# Altium schematic symbol library BARKO_SCHLIB.SchLib: 1064 symbols (part 9 of 11) (continued)
## R-10M-0603 (continued)
RES SMD 10M OHM 5% 1/10W 0603; Manufacturer: Yageo; Manufacturer Part Number: RC0603JR-0710ML; Resistance: 10MR; Temperature Coefficient: 100ppm/°C; Voltage Rating (DC): 50V; Power Rating: 100mW; .PCBCHK: USED; .Creator: F:TALI; Washability: OK; Stock 1: 1106306; Pricing 1: 1=0.1, 10=0.022, 100=0.0088, 1000=0.00396, 2500=0.00344 (USD); Case/Package: 0603; Number of Pins: 2; Contact Plating: Matte,Tin; Case Code (Metric): 1608; Min Operating Temperature: -55°C; Max Operating Temperature: 155°C; Tolerance: 5%; Composition: Thick Film; Packaging: Tape and Reel; Voltage Rating: 50V; Package Quantity: 1; Number of Terminations: 2; Termination: SMD/SMT; Military Standard: Not; Max Power Dissipation: 100mW; Features: Moisture Resistant; Length: 0.063inch; Height: 0.022inch; Width: 0.031inch; Depth: 0.8mm; Radiation Hardening: No; REACH SVHC: No SVHC; Lead Free: Lead Free; ComponentLink1URL: http://www.yageo.com/documents/recent/PYu-RC_Group_51_RoHS_L_9.pdf; ComponentLink1Description: http://www.yageo.com/documents/recent/PYu-RC_Group_51_RoHS_L_9.pdf; ComponentLink2URL: http://www.farnell.com/datasheets/443971.pdf; ComponentLink2Description: http://www.farnell.com/datasheets/443971.pdf; ComponentLink3URL: http://www.rohm.com/web/global/datasheet/KTR03EZPF/ktr-e; ComponentLink3Description: http://www.rohm.com/web/global/datasheet/KTR03EZPF/ktr-e; ComponentLink4URL: https://www.rohm.com/datasheet/KTR03EZPF/ktr-e; ComponentLink4Description: https://www.rohm.com/datasheet/KTR03EZPF/ktr-e; Stock 2: 697559; Pricing 2: 1=0.1, 10=0.043, 100=0.0176, 1000=0.00791, 2500=0.00686 (USD); Mount: Surface Mount; Weight: 7.1E-05oz; ComponentLink5URL: http://www.alliedelec.com/m/d/51cd0790071e1666bdb9d00c57fcf960.pdf; ComponentLink5Description: http://www.alliedelec.com/m/d/51cd0790071e1666bdb9d00c57fcf960.pdf; ComponentLink6URL: http://www.jameco.com/Jameco/Products/ProdDS/1988516.pdf; ComponentLink6Description: http://www.jameco.com/Jameco/Products/ProdDS/1988516.pdf; ComponentLink7URL: http://industrial.panasonic.com/www-data/pdf/AOA0000/AOA0000CE1.pdf; ComponentLink7Description: http://industrial.panasonic.com/www-data/pdf/AOA0000/AOA0000CE1.pdf; ComponentLink8URL: http://www.farnell.com/datasheets/1678796.pdf; ComponentLink8Description: http://www.farnell.com/datasheets/1678796.pdf; ComponentLink9URL: http://datasheet.octopart.com/ERJ-3GEYJ106V-Panasonic-datasheet-13266872.pdf; ComponentLink9Description: http://datasheet.octopart.com/ERJ-3GEYJ106V-Panasonic-datasheet-13266872.pdf; ComponentLink10URL: http://datasheet.octopart.com/ERJ-3GEYJ106V-Panasonic-datasheet-61114972.pdf; ComponentLink10Description: http://datasheet.octopart.com/ERJ-3GEYJ106V-Panasonic-datasheet-61114972.pdf; ComponentLink11URL: http://datasheet.octopart.com/ERJ-3GEYJ106V-Panasonic-datasheet-5314550.pdf; ComponentLink11Description: http://datasheet.octopart.com/ERJ-3GEYJ106V-Panasonic-datasheet-5314550.pdf; ComponentLink12URL: http://datasheet.octopart.com/ERJ-3GEYJ106V-Panasonic-datasheet-7538305.pdf; ComponentLink12Description: http://datasheet.octopart.com/ERJ-3GEYJ106V-Panasonic-datasheet-7538305.pdf; ComponentLink13URL: http://datasheet.octopart.com/ERJ-3GEYJ106V-Panasonic-datasheet-37173568.pdf; ComponentLink13Description: http://datasheet.octopart.com/ERJ-3GEYJ106V-Panasonic-datasheet-37173568.pdf; ComponentLink14URL: http://datasheet.octopart.com/ERJ-3GEYJ106V-Panasonic-datasheet-78375410.pdf; ComponentLink14Description: http://datasheet.octopart.com/ERJ-3GEYJ106V-Panasonic-datasheet-78375410.pdf; ComponentLink15URL: http://datasheet.octopart.com/ERJ-3GEYJ106V-Panasonic-datasheet-118598.pdf; ComponentLink15Description: http://datasheet.octopart.com/ERJ-3GEYJ106V-Panasonic-datasheet-118598.pdf; ComponentLink16URL: http://datasheet.octopart.com/ERJ3GEYJ106V-Panasonic-datasheet-27908757.pdf; ComponentLink16Description: http://datasheet.octopart.com/ERJ3GEYJ106V-Panasonic-datasheet-27908757.pdf; ComponentLink17URL: http://datasheet.octopart.com/RC0603JR-0710ML-Yageo-datasheet-8328172.pdf; ComponentLink17Description: http://datasheet.octopart.com/RC0603JR-0710ML-Yageo-datasheet-8328172.pdf; ComponentLink18URL: http://datasheet.octopart.com/RC0603JR-0710ML-Yageo-datasheet-34211833.pdf; ComponentLink18Description: http://datasheet.octopart.com/RC0603JR-0710ML-Yageo-datasheet-34211833.pdf; ComponentLink19URL: http://datasheet.octopart.com/RC0603JR-0710ML-Yageo-datasheet-62067350.pdf; ComponentLink19Description: http://datasheet.octopart.com/RC0603JR-0710ML-Yageo-datasheet-62067350.pdf; ComponentLink20URL: http://datasheet.octopart.com/RC0603JR-0710ML-Yageo-datasheet-12596169.pdf; ComponentLink20Description: http://datasheet.octopart.com/RC0603JR-0710ML-Yageo-datasheet-12596169.pdf; ComponentLink21URL: http://datasheet.octopart.com/RC0603JR-0710ML-Yageo-datasheet-27584510.pdf; ComponentLink21Description: http://datasheet.octopart.com/RC0603JR-0710ML-Yageo-datasheet-27584510.pdf; ComponentLink22URL: http://datasheet.octopart.com/RC0603JR-0710ML-Yageo-datasheet-30459151.pdf; ComponentLink22Description: http://datasheet.octopart.com/RC0603JR-0710ML-Yageo-datasheet-30459151.pdf; ComponentLink23URL: http://datasheet.octopart.com/RC0603JR-0710ML-Yageo-datasheet-73766026.pdf; ComponentLink23Description: http://datasheet.octopart.com/RC0603JR-0710ML-Yageo-datasheet-73766026.pdf; ComponentLink24URL: http://datasheet.octopart.com/RC0603JR-0710ML-Yageo-datasheet-118562.pdf; ComponentLink24Description: http://datasheet.octopart.com/RC0603JR-0710ML-Yageo-datasheet-118562.pdf; ComponentLink25URL: http://datasheet.octopart.com/RC0603JR-0710ML-Yageo-datasheet-8324193.pdf; ComponentLink25Description: http://datasheet.octopart.com/RC0603JR-0710ML-Yageo-datasheet-8324193.pdf; ComponentLink26URL: http://datasheet.octopart.com/RC0603JR-0710ML-Yageo-datasheet-15599030.pdf; ComponentLink26Description: http://datasheet.octopart.com/RC0603JR-0710ML-Yageo-datasheet-15599030.pdf; Stock 3: 137285; Pricing 3: 1=0.1, 10=0.016, 100=0.0064, 1000=0.00289, 2500=0.0025 (USD); ComponentLink27URL: http://components.arrow.com/part/dataview/40962265S7540440N1174; ComponentLink27Description: http://components.arrow.com/part/dataview/40962265S7540440N1174; ComponentLink28URL: http://datasheet.octopart.com/RMCF0603JT10M0-Stackpole-Electronics-datasheet-10788263.pdf; ComponentLink28Description: http://datasheet.octopart.com/RMCF0603JT10M0-Stackpole-Electronics-datasheet-10788263.pdf; ComponentLink29URL: http://datasheet.octopart.com/RMCF0603JT10M0-Stackpole-Electronics-datasheet-12534581.pdf; ComponentLink29Description: http://datasheet.octopart.com/RMCF0603JT10M0-Stackpole-Electronics-datasheet-12534581.pdf; ComponentLink30URL: http://datasheet.octopart.com/RMCF0603JT10M0-Stackpole-Electronics-datasheet-11546843.pdf; ComponentLink30Description: http://datasheet.octopart.com/RMCF0603JT10M0-Stackpole-Electronics-datasheet-11546843.pdf; ComponentLink31URL: http://datasheet.octopart.com/RMCF0603JT10M0-Stackpole-Electronics-datasheet-11547379.pdf; ComponentLink31Description: http://datasheet.octopart.com/RMCF0603JT10M0-Stackpole-Electronics-datasheet-11547379.pdf; ComponentLink32URL: http://datasheet.octopart.com/RMCF0603JT10M0-Stackpole-Electronics-datasheet-8324226.pdf; ComponentLink32Description: http://datasheet.octopart.com/RMCF0603JT10M0-Stackpole-Electronics-datasheet-8324226.pdf; ComponentLink33URL: http://datasheet.octopart.com/RMCF0603JT10M0-Stackpole-Electronics-datasheet-8359789.pdf; ComponentLink33Description: http://datasheet.octopart.com/RMCF0603JT10M0-Stackpole-Electronics-datasheet-8359789.pdf; ComponentLink34URL: http://datasheet.octopart.com/RMCF0603JT10M0-Stackpole-Electronics-datasheet-28504820.pdf; ComponentLink34Description: http://datasheet.octopart.com/RMCF0603JT10M0-Stackpole-Electronics-datasheet-28504820.pdf; .SCHCHK: USED; Supplier 1: Digi-Key; Supplier Part Number 1: RMCF0603JT10M0DKR-ND
footprint R-0603
pins: 1, 2

## R-10M-0805
designator R?, comment 10M  Case Code (Imperial): 0805
RES SMD 10M OHM 5% 1/8W 0805; Manufacturer: Yageo; Manufacturer Part Number: RC0805JR-0710ML; Resistance: 10MR; Temperature Coefficient: 100ppm/°C; Power Rating: 125mW; Voltage Rating: 150V; .PCBCHK: USED; .Creator: F:TALI; Washability: OK; Stock 1: 87462; Pricing 1: 1=0.1, 10=0.039, 100=0.0159, 1000=0.00716, 2500=0.00622 (USD); Case/Package: 0805; Contact Plating: Lead,Matte,Tin; Case Code (Metric): 2012; Min Operating Temperature: -55°C; Max Operating Temperature: 155°C; Tolerance: 5%; Composition: Thick Film; Packaging: Tape and Reel; Package Quantity: 1; Termination: SMD/SMT; Number of Terminations: 2; Military Standard: Not; Max Power Dissipation: 125mW; Features: Moisture Resistant; Length: 0.079inch; Height: 0.024inch; Width: 0.049inch; Depth: 1.25mm; Radiation Hardening: No; REACH SVHC: Unknown; Lead Free: Lead Free; ComponentLink1URL: http://www.mouser.com/ds/2/447/Yageo_08112016_RC0805-968729.pdf; ComponentLink1Description: http://www.mouser.com/ds/2/447/Yageo_08112016_RC0805-968729.pdf; ComponentLink2URL: http://www.yageo.com/documents/recent/PYu-RC_Group_51_RoHS_L_9.pdf; ComponentLink2Description: http://www.yageo.com/documents/recent/PYu-RC_Group_51_RoHS_L_9.pdf; Stock 2: 137952; Pricing 2: 1=0.1, 10=0.059, 100=0.024, 1000=0.01079, 2500=0.00936 (USD); Voltage Rating (DC): 150V; ComponentLink3URL: http://www.samsungsem.com/kr/support/product-search/chip-resistor/RC2012F106CS.jsp; ComponentLink3Description: http://www.samsungsem.com/kr/support/product-search/chip-resistor/RC2012F106CS.jsp; ComponentLink4URL: http://www.produktinfo.conrad.com/datenblaetter/450000-474999/457162-da-01-en-WIDERSTAND_0805.pdf; ComponentLink4Description: http://www.produktinfo.conrad.com/datenblaetter/450000-474999/457162-da-01-en-WIDERSTAND_0805.pdf; ComponentLink5URL: http://www.produktinfo.conrad.com/datenblaetter/425000-449999/444693-da-01-en-SMD_WIDERST__0805_RC_2012_10M0_1__0_125W.pdf; ComponentLink5Description: http://www.produktinfo.conrad.com/datenblaetter/425000-449999/444693-da-01-en-SMD_WIDERST__0805_RC_2012_10M0_1__0_125W.pdf; Stock 3: 364980; Pricing 3: 1=0.1, 10=0.061, 100=0.0249, 1000=0.0112, 2500=0.00972 (USD); Mount: Surface Mount; ComponentLink6URL: http://www.farnell.com/datasheets/2059623.pdf; ComponentLink6Description: http://www.farnell.com/datasheets/2059623.pdf; ComponentLink7URL: http://industrial.panasonic.com/www-data/pdf/AOA0000/AOA0000CE1.pdf; ComponentLink7Description: http://industrial.panasonic.com/www-data/pdf/AOA0000/AOA0000CE1.pdf; ComponentLink8URL: http://www.farnell.com/datasheets/1678796.pdf; ComponentLink8Description: http://www.farnell.com/datasheets/1678796.pdf; ComponentLink9URL: http://www.jameco.com/Jameco/Products/ProdDS/1989658.pdf; ComponentLink9Description: http://www.jameco.com/Jameco/Products/ProdDS/1989658.pdf; ComponentLink10URL: https://www.alliedelec.com/m/d/51cd0790071e1666bdb9d00c57fcf960.pdf; ComponentLink10Description: https://www.alliedelec.com/m/d/51cd0790071e1666bdb9d00c57fcf960.pdf; ComponentLink11URL: http://www.farnell.com/datasheets/1500035.pdf; ComponentLink11Description: http://www.farnell.com/datasheets/1500035.pdf; ComponentLink12URL: http://datasheet.octopart.com/ERJ-6GEYJ106V-Panasonic-datasheet-13266872.pdf; ComponentLink12Description: http://datasheet.octopart.com/ERJ-6GEYJ106V-Panasonic-datasheet-13266872.pdf; ComponentLink13URL: http://datasheet.octopart.com/ERJ-6GEYJ106V-Panasonic-datasheet-5314550.pdf; ComponentLink13Description: http://datasheet.octopart.com/ERJ-6GEYJ106V-Panasonic-datasheet-5314550.pdf; ComponentLink14URL: http://datasheet.octopart.com/ERJ-6GEYJ106V-Panasonic-datasheet-61114972.pdf; ComponentLink14Description: http://datasheet.octopart.com/ERJ-6GEYJ106V-Panasonic-datasheet-61114972.pdf; ComponentLink15URL: http://datasheet.octopart.com/ERJ-6GEYJ106V-Panasonic-datasheet-98225078.pdf; ComponentLink15Description: http://datasheet.octopart.com/ERJ-6GEYJ106V-Panasonic-datasheet-98225078.pdf; ComponentLink16URL: http://datasheet.octopart.com/ERJ-6GEYJ106V-Panasonic-datasheet-10554283.pdf; ComponentLink16Description: http://datasheet.octopart.com/ERJ-6GEYJ106V-Panasonic-datasheet-10554283.pdf; ComponentLink17URL: http://datasheet.octopart.com/ERJ-6GEYJ106V-Panasonic-datasheet-37173568.pdf; ComponentLink17Description: http://datasheet.octopart.com/ERJ-6GEYJ106V-Panasonic-datasheet-37173568.pdf; ComponentLink18URL: http://datasheet.octopart.com/ERJ-6GEYJ106V-Panasonic-datasheet-78375410.pdf; ComponentLink18Description: http://datasheet.octopart.com/ERJ-6GEYJ106V-Panasonic-datasheet-78375410.pdf; ComponentLink19URL: http://datasheet.octopart.com/ERJ-6GEYJ106V-Panasonic-datasheet-118598.pdf; ComponentLink19Description: http://datasheet.octopart.com/ERJ-6GEYJ106V-Panasonic-datasheet-118598.pdf; ComponentLink20URL: http://datasheet.octopart.com/ERJ-6GEYJ106V-Panasonic-datasheet-5313456.pdf; ComponentLink20Description: http://datasheet.octopart.com/ERJ-6GEYJ106V-Panasonic-datasheet-5313456.pdf; ComponentLink21URL: http://datasheet.octopart.com/ERJ-6GEYJ106V-Panasonic-datasheet-11480398.pdf; ComponentLink21Description: http://datasheet.octopart.com/ERJ-6GEYJ106V-Panasonic-datasheet-11480398.pdf; ComponentLink22URL: http://datasheet.octopart.com/ERJ-6GEYJ106V-Panasonic---ECG-datasheet-15994758.pdf; ComponentLink22Description: http://datasheet.octopart.com/ERJ-6GEYJ106V-Panasonic---ECG-datasheet-15994758.pdf; ComponentLink23URL: http://datasheet.octopart.com/ERJ6GEYJ106V-Panasonic-datasheet-27908757.pdf; ComponentLink23Description: http://datasheet.octopart.com/ERJ6GEYJ106V-Panasonic-datasheet-27908757.pdf; .SCHCHK: USED; Supplier 1: Digi-Key; Supplier Part Number 1: 311-10MARDKR-ND
footprint R-0805
pins: 1, 2

## R-10R-0603
designator R?, comment 10R  Case/Package: 0603  Tolerance: 1%
RES 10 OHM 1% 1/8W 0603; Manufacturer: Stackpole Electronics; Manufacturer Part Number: RNCP0603FTD10R0; Temperature Coefficient: 100ppm/°C; Max Power Dissipation: 125mW; Washability: OK; .Creator: M.OZKAN; .PCBCHK: USED; Supplier 1: Digi-Key; Supplier Part Number 1: RNCP0603FTD10R0CT-ND; Stock 1: 279793; Pricing 1: 1=0.10000, 10=0.06700, 100=0.02730, 1000=0.01224, 2500=0.01063 (USD); RoHS: Yes; Mount: Surface Mount; Case Code (Imperial): 0603; Case Code (Metric): 1608; Min Operating Temperature: -55°C; Max Operating Temperature: 155°C; Resistance: 10R; Packaging: Tape and Reel; Features: Moisture Resistant,Anti-Sulfur; Composition: Thin Film; Number of Terminations: 2; Length: 0.059inch; Height: 0.02inch; Width: 0.031inch; Lead Free: Lead Free; ComponentLink1URL: https://www.seielect.com/catalog/SEI-Packaging.pdf?src-supplier=Digi-Key; ComponentLink1Description: https://www.seielect.com/catalog/SEI-Packaging.pdf?src-supplier=Digi-Key; ComponentLink2URL: https://www.seielect.com/Catalog/SEI-rncp.pdf?src-supplier=Digi-Key; ComponentLink2Description: https://www.seielect.com/Catalog/SEI-rncp.pdf?src-supplier=Digi-Key; .SCHCHK: USED
footprint R-0603
pins: 1, 2

## R-10R-0805
designator R?, comment 10R  Case Code (Imperial): 0805  Power Rating: 0.4W
RES SMD 10 OHM 5% 0.4W 0805; Manufacturer: Rohm; Manufacturer Part Number: ESR10EZPJ100; Max Power Dissipation: 400mW; Temperature Coefficient: 200ppm/°C; Working Voltage: 150V; .PCBCHK: USED; .Creator: F:TALI; Washability: OK; Stock 1: 283261; Case/Package: 0805; Case Code (Metric): 2012; Min Operating Temperature: -55°C; Max Operating Temperature: 155°C; Package Quantity: 1; Resistance: 10R; Tolerance: 5%; Packaging: Tape and Reel; Composition: Thick Film; Number of Terminations: 2; Features: Automotive AEC-Q200; Length: 0.079inch; Height: 0.026inch; Width: 0.049inch; Lead Free: Lead Free; ComponentLink1URL: https://www.rohm.com/datasheet/ESR01MZPF/esr-e; ComponentLink1Description: https://www.rohm.com/datasheet/ESR01MZPF/esr-e; ComponentLink2URL: http://www1.futureelectronics.com/doc/ROHM%20SEMICONDUCTOR/ESR10EZPD.pdf; ComponentLink2Description: http://www1.futureelectronics.com/doc/ROHM%20SEMICONDUCTOR/ESR10EZPD.pdf; ComponentLink3URL: http://rohmfs.rohm.com/en/products/databook/datasheet/passive/resistor/chip_resistor/esr.pdf; ComponentLink3Description: http://rohmfs.rohm.com/en/products/databook/datasheet/passive/resistor/chip_resistor/esr.pdf; ComponentLink4URL: http://www.rohm.com/web/global/datasheet/ESR01MZPF/esr-e; ComponentLink4Description: http://www.rohm.com/web/global/datasheet/ESR01MZPF/esr-e; Stock 2: 110366; Pricing 2: 1=0.17, 10=0.146, 100=0.0572, 1000=0.02396, 2500=0.02196 (USD); Stock 3: 35092; Pricing 3: 1=0.21, 10=0.174, 100=0.0682, 1000=0.02853, 2500=0.02616 (USD); .SCHCHK: USED; Supplier 1: Digi-Key; Supplier Part Number 1: RHM10KCT-ND
footprint R-0805
pins: 1, 2

## R-10R-1206
designator R?, comment 10R  Case Code (Imperial): 1206
RES SMD 10 OHM 5% 1/2W 1206; Manufacturer: Stackpole Electronics; Manufacturer Part Number: RNCP1206FTD10R0; .PCBCHK: USED; .Creator: F:TALI; Washability: OK; Tolerance: 1%; Max Power Dissipation: 500mW; Temperature Coefficient: 100ppm/°C; ComponentLink1URL: http://www.farnell.com/datasheets/1936783.pdf; ComponentLink1Description: http://www.farnell.com/datasheets/1936783.pdf; ComponentLink2URL: http://www.farnell.com/datasheets/1859481.pdf; ComponentLink2Description: http://www.farnell.com/datasheets/1859481.pdf; ComponentLink3URL: https://www.bourns.com/docs/Product-Datasheets/CRM0805_1206_2010.pdf; ComponentLink3Description: https://www.bourns.com/docs/Product-Datasheets/CRM0805_1206_2010.pdf; ComponentLink4URL: http://www.produktinfo.conrad.com/datenblaetter/1000000-1099999/001055576-da-01-en-WID_CRM1206_FX_10R0ELF__10_OHM_1_2W_1_.pdf; ComponentLink4Description: http://www.produktinfo.conrad.com/datenblaetter/1000000-1099999/001055576-da-01-en-WID_CRM1206_FX_10R0ELF__10_OHM_1_2W_1_.pdf; ComponentLink5URL: http://www.rohm.com/web/global/datasheet/ESR01MZPF/esr-e; ComponentLink5Description: http://www.rohm.com/web/global/datasheet/ESR01MZPF/esr-e; ComponentLink6URL: https://www.rohm.com/datasheet/ESR01MZPF/esr-e; ComponentLink6Description: https://www.rohm.com/datasheet/ESR01MZPF/esr-e; .SCHCHK: USED; Supplier 1: Digi-Key; Supplier Part Number 1: RNCP1206FTD10R0CT-ND; Stock: 154750; Pricing: 1=0.1, 10=0.081, 100=0.031, 1000=0.0136, 2500=0.0118 (USD); RoHS: Yes; Mount: Surface Mount; Case/Package: 1206; Contact Plating: Tin,Matte; Case Code (Metric): 3216; Min Operating Temperature: -55°C; Max Operating Temperature: 155°C; Resistance: 10R; Packaging: Tape and Reel; Resistor Type: Thin Film; Number of Terminations: 2; Features: Moisture Resistant,Anti-Sulfur; Length: 0.122inch; Height: 0.024inch; Width: 0.059inch; Lead Free: Lead Free; ComponentLink7URL: https://www.seielect.com/catalog/SEI-Packaging.pdf?src-supplier=Digi-Key; ComponentLink7Description: https://www.seielect.com/catalog/SEI-Packaging.pdf?src-supplier=Digi-Key; ComponentLink8URL: https://www.seielect.com/Catalog/SEI-rncp.pdf?src-supplier=Avnet; ComponentLink8Description: https://www.seielect.com/Catalog/SEI-rncp.pdf?src-supplier=Avnet
footprint R-1206
pins: 1, 2

## R-12K4-0603
designator R?, comment 12K4  Tolerance: 1%  Case/Package: 0603
RES SMD 12.4K OHM 1% 1/8W 0603; Manufacturer: Stackpole Electronics; Manufacturer Part Number: RNCP0603FTD12K4; Resistance: 12.4kR; Max Power Dissipation: 125mW; Temperature Coefficient: 100ppm/°C; Washability: OK; .Creator: M.OZKAN; .PCBCHK: USED; Supplier 1: Digi-Key; Supplier Part Number 1: RNCP0603FTD12K4CT-ND; Stock 1: 24452; Pricing 1: 1=0.10000, 10=0.06700, 100=0.02730, 1000=0.01224, 2500=0.01063 (USD); RoHS: Yes; Mount: Surface Mount; Case Code (Metric): 1608; Case Code (Imperial): 0603; Min Operating Temperature: -55°C; Max Operating Temperature: 155°C; Packaging: Cut Tape; Composition: Thin Film; Number of Terminations: 2; Features: Moisture Resistant,Anti-Sulfur; Length: 0.059inch; Height: 0.02inch; Width: 0.031inch; ComponentLink1URL: https://www.seielect.com/Catalog/SEI-rncp.pdf?src-supplier=Digi-Key; ComponentLink1Description: https://www.seielect.com/Catalog/SEI-rncp.pdf?src-supplier=Digi-Key; ComponentLink2URL: http://www.seielect.com/Catalog/SEI-rncp.pdf?src-supplier=Digi-Key; ComponentLink2Description: http://www.seielect.com/Catalog/SEI-rncp.pdf?src-supplier=Digi-Key; .SCHCHK: USED
footprint R-0603
pins: 1, 2

## R-12K-0603
designator R?, comment 12K  Case Code (Imperial): 0603
RES SMD 12K OHM 5% 1/10W 0603; Manufacturer: Yageo; Manufacturer Part Number: RC0603JR-0712KL; Resistance: 12kR; Temperature Coefficient: 100ppm/°C; Voltage Rating (DC): 50V; Power Rating: 100mW; .PCBCHK: USED; .Creator: F:TALI; Washability: OK; Stock 1: 660; Pricing 1: 1=0.1, 10=0.022, 100=0.0088, 1000=0.00396, 2500=0.00344 (USD); Case/Package: 0603; Number of Pins: 2; Case Code (Metric): 1608; Min Operating Temperature: -55°C; Max Operating Temperature: 155°C; Tolerance: 5%; Composition: Thick Film; Packaging: Tape and Reel; Voltage Rating: 50V; Package Quantity: 1; Number of Terminations: 2; Termination: SMD/SMT; Military Standard: Not; Max Power Dissipation: 100mW; Features: Moisture Resistant; Length: 0.063inch; Height: 0.022inch; Width: 0.031inch; Depth: 0.8mm; REACH SVHC: No SVHC; Lead Free: Lead Free; ComponentLink1URL: http://www.yageo.com/documents/recent/PYu-RC_Group_51_RoHS_L_9.pdf; ComponentLink1Description: http://www.yageo.com/documents/recent/PYu-RC_Group_51_RoHS_L_9.pdf; ComponentLink2URL: http://www.farnell.com/datasheets/443971.pdf; ComponentLink2Description: http://www.farnell.com/datasheets/443971.pdf; Stock 2: 19890; Pricing 2: 1=0.1, 10=0.016, 100=0.0064, 1000=0.00289, 2500=0.0025 (USD); Mount: Surface Mount; Contact Plating: Matte,Tin; Radiation Hardening: No; ComponentLink3URL: https://www.verical.com/server-webapp/html/getDatasheet?partID=702314; ComponentLink3Description: https://www.verical.com/server-webapp/html/getDatasheet?partID=702314; Stock 3: 529865; Pricing 3: 1=0.1, 10=0.016, 100=0.0064, 1000=0.00289, 2500=0.0025 (USD); ComponentLink4URL: https://www.verical.com/server-webapp/html/getDatasheet?partID=364254; ComponentLink4Description: https://www.verical.com/server-webapp/html/getDatasheet?partID=364254; .SCHCHK: USED; Supplier 1: Digi-Key; Supplier Part Number 1: RMCF0603JT10K0CT-ND
footprint R-0603
pins: 1, 2

## R-13K3-0603
designator R?, comment 13K3  Case Code (Imperial): 0603
RES SMD 13.3K OHM 1% 1/10W 0603; Manufacturer: Yageo; Manufacturer Part Number: RC0603FR-0713K3L; Power Rating: 100mW; Resistance: 13.3kR; Voltage Rating: 50V; Temperature Coefficient: 100ppm/°C; .PCBCHK: USED; .Creator: F:TALI; Washability: OK; Stock 1: 185313; Pricing 1: 1=0.1, 10=0.026, 100=0.0107, 1000=0.00478, 2500=0.00415 (USD); Mount: Surface Mount; Case/Package: 0603; Case Code (Metric): 1608; Min Operating Temperature: -55°C; Max Operating Temperature: 155°C; Tolerance: 1%; Packaging: Tape and Reel; Package Quantity: 1; Composition: Thick Film; Number of Terminations: 2; Termination: SMD/SMT; Military Standard: Not; Max Power Dissipation: 100mW; Voltage Rating (DC): 50V; Features: Moisture Resistant; Length: 1.6mm; Height: 0.022inch; Width: 0.031inch; Depth: 0.8mm; Lead Free: Lead Free; ComponentLink1URL: http://documents.rs-components.com/techlib://itc_doclist_GB.htm?stockno=5049476; ComponentLink1Description: http://documents.rs-components.com/techlib://itc_doclist_GB.htm?stockno=5049476; ComponentLink2URL: https://www.verical.com/server-webapp/html/getDatasheet?partID=323984; ComponentLink2Description: https://www.verical.com/server-webapp/html/getDatasheet?partID=323984; ComponentLink3URL: http://www.yageo.com/documents/recent/PYu-RC_Group_51_RoHS_L_9.pdf; ComponentLink3Description: http://www.yageo.com/documents/recent/PYu-RC_Group_51_RoHS_L_9.pdf; Stock 2: 8055; Pricing 2: 1=0.1, 10=0.021, 100=0.0086, 1000=0.00385, 2500=0.00334 (USD); Contact Plating: Tin; Thickness: 457um; Radiation Hardening: No; ComponentLink4URL: http://www.bourns.com/pdfs/chpreztr.pdf; ComponentLink4Description: http://www.bourns.com/pdfs/chpreztr.pdf; ComponentLink5URL: http://www.bourns.com/data/global/pdfs/CHPREZTR.pdf; ComponentLink5Description: http://www.bourns.com/data/global/pdfs/CHPREZTR.pdf; ComponentLink6URL: http://www.bourns.com/docs/Product-Datasheets/CHPREZTR.pdf; ComponentLink6Description: http://www.bourns.com/docs/Product-Datasheets/CHPREZTR.pdf; Stock 3: 250374; Pricing 3: 1=0.1, 10=0.065, 100=0.0264, 1000=0.01186, 2500=0.01029 (USD); REACH SVHC: No SVHC; ComponentLink7URL: http://www.jameco.com/Jameco/Products/ProdDS/1987636.pdf; ComponentLink7Description: http://www.jameco.com/Jameco/Products/ProdDS/1987636.pdf; ComponentLink8URL: http://www.farnell.com/datasheets/1911175.pdf; ComponentLink8Description: http://www.farnell.com/datasheets/1911175.pdf; ComponentLink9URL: http://www.farnell.com/datasheets/426256.pdf; ComponentLink9Description: http://www.farnell.com/datasheets/426256.pdf; ComponentLink10URL: https://www.alliedelec.com/m/d/623f45ff1957d936ff56d46fd1c28cac.pdf; ComponentLink10Description: https://www.alliedelec.com/m/d/623f45ff1957d936ff56d46fd1c28cac.pdf; ComponentLink11URL: http://www.farnell.com/datasheets/1678782.pdf; ComponentLink11Description: http://www.farnell.com/datasheets/1678782.pdf; .SCHCHK: USED; Supplier 1: Digi-Key; Supplier Part Number 1: 311-13.3KHRDKR-ND
footprint R-0603
pins: 1, 2

## R-13K-0805
designator R?, comment 13K  Case Code (Imperial): 0805
RES 13K OHM 1% 1/8W 0805; Manufacturer: Stackpole Electronics; Manufacturer Part Number: RMCF0805FT13K0; .PCBCHK: USED; .Creator: F:TALI; Washability: OK; Max Power Dissipation: 125mW; Temperature Coefficient: 100ppm/°C; Resistance: 13kR; .SCHCHK: USED; Supplier 1: Digi-Key; Supplier Part Number 1: RMCF0805FT13K0CT-ND; Stock: 2206; Pricing: 1=0.1, 10=0.023, 100=0.0094, 1000=0.0042, 2500=0.0037 (USD); RoHS: Yes; Mount: Surface Mount; Case/Package: 0805; Contact Plating: Tin,Matte; Case Code (Metric): 2012; Min Operating Temperature: -55°C; Max Operating Temperature: 155°C; Resistor Type: Thick Film; Number of Terminations: 2; Features: Automotive AEC-Q200; Packaging: Tape and Reel; Tolerance: 1%; Length: 2mm; Height: 0.026inch; Depth: 1.25mm; Width: 0.049inch; Radiation Hardening: No; Military Standard: Not; ComponentLink1URL: https://www.verical.com/server-webapp/html/getDatasheet?partID=364256&src-supplier=Verical; ComponentLink1Description: https://www.verical.com/server-webapp/html/getDatasheet?partID=364256&src-supplier=Verical; ComponentLink2URL: http://components.arrow.com/part/dataview/40964035S7077192N1174?src-supplier=Arrow+Electronics; ComponentLink2Description: http://components.arrow.com/part/dataview/40964035S7077192N1174?src-supplier=Arrow+Electronics; ComponentLink3URL: https://www.seielect.com/catalog/SEI-Packaging.pdf?src-supplier=Digi-Key; ComponentLink3Description: https://www.seielect.com/catalog/SEI-Packaging.pdf?src-supplier=Digi-Key; ComponentLink4URL: https://www.seielect.com/Catalog/SEI-RMCF_RMCP.pdf?src-supplier=Digi-Key; ComponentLink4Description: https://www.seielect.com/Catalog/SEI-RMCF_RMCP.pdf?src-supplier=Digi-Key; ComponentLink5URL: https://www.seielect.com/catalog/SEI-RMCF_RMCP.pdf?src-supplier=Avnet; ComponentLink5Description: https://www.seielect.com/catalog/SEI-RMCF_RMCP.pdf?src-supplier=Avnet
footprint R-0805
pins: 1, 2

## R-15K8-0603
designator R?, comment 15K8  Case Code (Imperial): 0603
RES SMD 15.8K OHM 1% 1/10W 0603; Manufacturer: Yageo; Manufacturer Part Number: RC0603FR-0715K8L; Resistance: 15.8kR; Power Rating: 100mW; Temperature Coefficient: 100ppm/°C; Voltage Rating (DC): 50V; Voltage Rating: 75V; .PCBCHK: USED; .Creator: F:TALI; Washability: OK; Stock 1: 88007; Pricing 1: 1=0.1, 10=0.026, 100=0.0107, 1000=0.00478, 2500=0.00415 (USD); Case/Package: 0603; Case Code (Metric): 1608; Min Operating Temperature: -55°C; Max Operating Temperature: 155°C; Package Quantity: 1; Tolerance: 1%; Packaging: Tape and Reel; Composition: Thick Film; Number of Terminations: 2; Military Standard: Not; Max Power Dissipation: 100mW; Features: Moisture Resistant; Length: 1.6mm; Height: 0.022inch; Width: 0.031inch; Depth: 0.8mm; Lead Free: Lead Free; ComponentLink1URL: http://www.yageo.com.tw/exep/pages/download/literatures/PYu-R_INT-thick_7.pdf; ComponentLink1Description: http://www.yageo.com.tw/exep/pages/download/literatures/PYu-R_INT-thick_7.pdf; ComponentLink2URL: http://www.yageo.com/documents/recent/PYu-RC_Group_51_RoHS_L_9.pdf; ComponentLink2Description: http://www.yageo.com/documents/recent/PYu-RC_Group_51_RoHS_L_9.pdf; ComponentLink3URL: https://www.verical.com/server-webapp/html/getDatasheet?partID=323764; ComponentLink3Description: https://www.verical.com/server-webapp/html/getDatasheet?partID=323764; Stock 2: 68273; Pricing 2: 1=0.1, 10=0.018, 100=0.0071, 1000=0.00321, 2500=0.00278 (USD); Mount: Surface Mount; Contact Plating: Matte,Tin; Radiation Hardening: No; Weight: 7.1E-05oz; Termination: SMD/SMT; REACH SVHC: Unknown; ComponentLink4URL: http://www.farnell.com/datasheets/426256.pdf; ComponentLink4Description: http://www.farnell.com/datasheets/426256.pdf; ComponentLink5URL: https://www.alliedelec.com/m/d/623f45ff1957d936ff56d46fd1c28cac.pdf; ComponentLink5Description: https://www.alliedelec.com/m/d/623f45ff1957d936ff56d46fd1c28cac.pdf; ComponentLink6URL: http://www.farnell.com/datasheets/1911175.pdf; ComponentLink6Description: http://www.farnell.com/datasheets/1911175.pdf; ComponentLink7URL: http://www.farnell.com/datasheets/1678782.pdf; ComponentLink7Description: http://www.farnell.com/datasheets/1678782.pdf; ComponentLink8URL: http://industrial.panasonic.com/www-data/pdf/AOA0000/AOA0000CE2.pdf; ComponentLink8Description: http://industrial.panasonic.com/www-data/pdf/AOA0000/AOA0000CE2.pdf; ComponentLink9URL: http://www.mouser.com/ds/2/315/AOA0000C304-1149620.pdf; ComponentLink9Description: http://www.mouser.com/ds/2/315/AOA0000C304-1149620.pdf; Stock 3: 4920; Pricing 3: 1=0.11, 10=0.098, 100=0.0376, 1000=0.01654, 2500=0.01428 (USD); ComponentLink10URL: http://www.susumu.co.jp/common/pdf/n_catalog_partition05_en.pdf; ComponentLink10Description: http://www.susumu.co.jp/common/pdf/n_catalog_partition05_en.pdf; .SCHCHK: USED; Supplier 1: Digi-Key; Supplier Part Number 1: RMCF0603FT15K8DKR-ND
footprint R-0603
pins: 1, 2

## R-15K-0402
designator R?, comment 15K  Case Code (Imperial): 0402
RES SMD 15K OHM 1% 1/10W 0402; Manufacturer: Panasonic; Manufacturer Part Number: ERJ-2RKF1502X; Resistance: 15kR; Temperature Coefficient: 100ppm/°C; Voltage Rating: 50V; Power Rating: 100mW; .PCBCHK: USED; .Creator: F:TALI; Washability: OK; Stock 1: 3198961; Pricing 1: 1=0.1, 10=0.045, 100=0.0183, 1000=0.00823, 2500=0.00715, 5000=0.0059 (USD); Mount: Surface Mount; Case/Package: 0402; Number of Pins: 2; Weight: 2.8E-05oz; Contact Plating: Tin; Case Code (Metric): 1005; Min Operating Temperature: -55°C; Max Operating Temperature: 155°C; Tolerance: 1%; Composition: Thick Film; Packaging: Tape and Reel; Package Quantity: 1; Termination: SMD/SMT; Number of Terminations: 2; Military Standard: Not; Max Power Dissipation: 100mW; Voltage Rating (DC): 50V; Features: Automotive AEC-Q200; Length: 1mm; Height: 0.35mm; Width: 0.5mm; Depth: 0.5mm; Radiation Hardening: No; REACH SVHC: No SVHC; Lead Free: Lead Free; ComponentLink1URL: http://www.farnell.com/datasheets/1678782.pdf; ComponentLink1Description: http://www.farnell.com/datasheets/1678782.pdf; ComponentLink2URL: https://industrial.panasonic.com/cdbs/www-data/pdf/RDA0000/DMA0000COL11.pdf; ComponentLink2Description: https://industrial.panasonic.com/cdbs/www-data/pdf/RDA0000/DMA0000COL11.pdf; ComponentLink3URL: http://www.farnell.com/datasheets/1911175.pdf; ComponentLink3Description: http://www.farnell.com/datasheets/1911175.pdf; ComponentLink4URL: http://www.farnell.com/datasheets/426256.pdf; ComponentLink4Description: http://www.farnell.com/datasheets/426256.pdf; ComponentLink5URL: http://industrial.panasonic.com/www-data/pdf/AOA0000/AOA0000CE2.pdf; ComponentLink5Description: http://industrial.panasonic.com/www-data/pdf/AOA0000/AOA0000CE2.pdf; Stock 2: 1068394; Pricing 2: 1=0.1, 10=0.031, 100=0.0125, 1000=0.0056, 2500=0.00486, 5000=0.00401 (USD); ComponentLink6URL: http://industrial.panasonic.com/www-data/pdf/AOA0000/AOA0000CE1.pdf; ComponentLink6Description: http://industrial.panasonic.com/www-data/pdf/AOA0000/AOA0000CE1.pdf; ComponentLink7URL: https://www.alliedelec.com/m/d/51cd0790071e1666bdb9d00c57fcf960.pdf; ComponentLink7Description: https://www.alliedelec.com/m/d/51cd0790071e1666bdb9d00c57fcf960.pdf; ComponentLink8URL: http://www.farnell.com/datasheets/2059623.pdf; ComponentLink8Description: http://www.farnell.com/datasheets/2059623.pdf; ComponentLink9URL: http://www.farnell.com/datasheets/1500035.pdf; ComponentLink9Description: http://www.farnell.com/datasheets/1500035.pdf; ComponentLink10URL: http://www.farnell.com/datasheets/1678796.pdf; ComponentLink10Description: http://www.farnell.com/datasheets/1678796.pdf; Stock 3: 7644; Pricing 3: 1=0.15, 10=0.134, 100=0.0516, 1000=0.02268, 2500=0.01959, 5000=0.01753 (USD); ComponentLink11URL: http://www.susumu.co.jp/common/pdf/n_catalog_partition01_en.pdf; ComponentLink11Description: http://www.susumu.co.jp/common/pdf/n_catalog_partition01_en.pdf; ComponentLink12URL: http://www.mouser.com/ds/2/392/n_catalog_partition01_en-1140338.pdf; ComponentLink12Description: http://www.mouser.com/ds/2/392/n_catalog_partition01_en-1140338.pdf; ComponentLink13URL: https://www.verical.com/server-webapp/html/getDatasheet?partID=495770; ComponentLink13Description: https://www.verical.com/server-webapp/html/getDatasheet?partID=495770; .SCHCHK: USED; Supplier 1: Digi-Key; Supplier Part Number 1: P15.0KLDKR-ND
footprint R-0402
pins: 1, 2

## R-15K-0805
designator R?, comment 15K  Case/Package: 0805
RES SMD 15K OHM 1% 1/8W 0805; Manufacturer: Yageo; Manufacturer Part Number: RC0805FR-0715KL; Resistance: 15kR; Voltage Rating (DC): 150V; Temperature Coefficient: 100ppm/°C; Power Rating: 125mW; .PCBCHK: USED; .Creator: F:TALI; Washability: OK; Stock 1: 355040; Pricing 1: 1=0.1, 10=0.046, 100=0.0186, 1000=0.00835, 2500=0.00725 (USD); Number of Pins: 2; Weight: 0.000194oz; Case Code (Metric): 2012; Case Code (Imperial): 0805; Min Operating Temperature: -55°C; Max Operating Temperature: 155°C; Tolerance: 1%; Packaging: Tape and Reel; Composition: Thick Film; Voltage Rating: 150V; Package Quantity: 1; Number of Terminations: 2; Termination: SMD/SMT; Military Standard: Not; Max Power Dissipation: 125mW; Features: Moisture Resistant; Length: 2mm; Height: 0.5mm; Width: 1.25mm; Depth: 1.25mm; REACH SVHC: No SVHC; Lead Free: Lead Free; ComponentLink1URL: http://www.farnell.com/datasheets/444164.pdf; ComponentLink1Description: http://www.farnell.com/datasheets/444164.pdf; ComponentLink2URL: http://www.yageo.com/documents/recent/PYu-RC_Group_51_RoHS_L_9.pdf; ComponentLink2Description: http://www.yageo.com/documents/recent/PYu-RC_Group_51_RoHS_L_9.pdf; ComponentLink3URL: http://www.mouser.com/ds/2/447/RC0805-257173.pdf; ComponentLink3Description: http://www.mouser.com/ds/2/447/RC0805-257173.pdf; Stock 2: 697023; Pricing 2: 1=0.1, 10=0.081, 100=0.0311, 1000=0.01367, 2500=0.01181 (USD); Mount: Surface Mount; Contact Plating: Tin; Radiation Hardening: No; ComponentLink4URL: http://industrial.panasonic.com/www-data/pdf/AOA0000/AOA0000CE2.pdf; ComponentLink4Description: http://industrial.panasonic.com/www-data/pdf/AOA0000/AOA0000CE2.pdf; ComponentLink5URL: https://www.alliedelec.com/m/d/623f45ff1957d936ff56d46fd1c28cac.pdf; ComponentLink5Description: https://www.alliedelec.com/m/d/623f45ff1957d936ff56d46fd1c28cac.pdf; ComponentLink6URL: http://www.farnell.com/datasheets/1678782.pdf; ComponentLink6Description: http://www.farnell.com/datasheets/1678782.pdf; ComponentLink7URL: http://www.farnell.com/datasheets/426256.pdf; ComponentLink7Description: http://www.farnell.com/datasheets/426256.pdf; ComponentLink8URL: http://www.jameco.com/Jameco/Products/ProdDS/1989076.pdf; ComponentLink8Description: http://www.jameco.com/Jameco/Products/ProdDS/1989076.pdf; Stock 3: 273973; Pricing 3: 1=0.1, 10=0.061, 100=0.0249, 1000=0.0112, 2500=0.00972 (USD); ComponentLink9URL: http://www.farnell.com/datasheets/1500035.pdf; ComponentLink9Description: http://www.farnell.com/datasheets/1500035.pdf; ComponentLink10URL: http://industrial.panasonic.com/www-data/pdf/AOA0000/AOA0000CE1.pdf; ComponentLink10Description: http://industrial.panasonic.com/www-data/pdf/AOA0000/AOA0000CE1.pdf; ComponentLink11URL: http://components.arrow.com/part/dataview/3982532S182847N1386; ComponentLink11Description: http://components.arrow.com/part/dataview/3982532S182847N1386; ComponentLink12URL: https://www.verical.com/server-webapp/html/getDatasheet?partID=28965; ComponentLink12Description: https://www.verical.com/server-webapp/html/getDatasheet?partID=28965; ComponentLink13URL: https://www.alliedelec.com/m/d/51cd0790071e1666bdb9d00c57fcf960.pdf; ComponentLink13Description: https://www.alliedelec.com/m/d/51cd0790071e1666bdb9d00c57fcf960.pdf; ComponentLink14URL: http://www.farnell.com/datasheets/2059623.pdf; ComponentLink14Description: http://www.farnell.com/datasheets/2059623.pdf; Working Voltage: 150V; ComponentLink15URL: http://www.mouser.com/ds/2/447/Yageo_08112016_RC0805-968729.pdf; ComponentLink15Description: http://www.mouser.com/ds/2/447/Yageo_08112016_RC0805-968729.pdf; ComponentLink16URL: http://www.yageo.com/documents/recent/PYu-RC_Group_51_RoHS_L_8.pdf; ComponentLink16Description: http://www.yageo.com/documents/recent/PYu-RC_Group_51_RoHS_L_8.pdf; ComponentLink17URL: http://www.yageo.ru/pdf/RC0805.pdf; ComponentLink17Description: http://www.yageo.ru/pdf/RC0805.pdf; .SCHCHK: USED; Supplier 1: Digi-Key; Supplier Part Number 1: 311-15.0KCRDKR-ND
footprint R-0805
pins: 1, 2

## R-16K-0603
designator R?, comment 16K  Case Code (Imperial): 0603
RES SMD 16K OHM 1% 1/10W 0603; Manufacturer: Stackpole Electronics; Manufacturer Part Number: RMCF0603FT16K0; Resistance: 16kR; Max Power Dissipation: 100mW; Temperature Coefficient: 100ppm/°C; Supplier 1: Digi-Key; Supplier Part Number 1: RMCF0603FT16K0CT-ND; Stock: 56507; Pricing: 1=0.1, 10=0.015, 100=0.0059, 1000=0.0027, 2500=0.0023 (USD); RoHS: Yes; Mount: Surface Mount; Case/Package: 0603; Case Code (Metric): 1608; Contact Plating: Tin,Matte; Min Operating Temperature: -55°C; Max Operating Temperature: 155°C; Features: Automotive AEC-Q200; Packaging: Tape and Reel; Tolerance: 1%; Resistor Type: Thick Film; Number of Terminations: 2; Length: 0.061inch; Height: 0.022inch; Width: 0.031inch; Radiation Hardening: No; Lead Free: Lead Free; ComponentLink1URL: http://components.arrow.com/part/dataview/50862390S111928N1174?src-supplier=Arrow+Electronics; ComponentLink1Description: http://components.arrow.com/part/dataview/50862390S111928N1174?src-supplier=Arrow+Electronics; ComponentLink2URL: https://www.seielect.com/catalog/SEI-RMCF_RMCP.pdf?src-supplier=Avnet; ComponentLink2Description: https://www.seielect.com/catalog/SEI-RMCF_RMCP.pdf?src-supplier=Avnet; ComponentLink3URL: https://www.seielect.com/Catalog/SEI-RMCF_RMCP.pdf?src-supplier=Digi-Key; ComponentLink3Description: https://www.seielect.com/Catalog/SEI-RMCF_RMCP.pdf?src-supplier=Digi-Key; ComponentLink4URL: https://www.seielect.com/catalog/SEI-Packaging.pdf?src-supplier=Digi-Key; ComponentLink4Description: https://www.seielect.com/catalog/SEI-Packaging.pdf?src-supplier=Digi-Key
footprint R-0603
pins: 1, 2

## R-16R-0603
designator R?, comment 16R  Case Code (Imperial): 0603
RES SMD 16 OHM 1% 1/10W 0603; Manufacturer: Yageo; Manufacturer Part Number: RC0603FR-0716RL; Power Rating: 100mW; Voltage Rating: 50V; Temperature Coefficient: 100ppm/°C; Working Voltage: 75V; Washability: OK; .Creator: M.OZKAN; .PCBCHK: USED; Supplier 1: Future Electronics; Stock 1: 582; Pricing 1: 1=0,09800, 250=0,00950, 750=0,00610, 1500=0,00450, 2500=0,00370 (USD); RoHS: Yes; Case/Package: 0603; Case Code (Metric): 1608; Min Operating Temperature: -55°C; Max Operating Temperature: 155°C; Packaging: Tape and Reel; Resistance: 16R; Tolerance: 1%; Package Quantity: 1; Termination: SMD/SMT; Composition: Thick Film; Number of Terminations: 2; Max Power Dissipation: 100mW; Voltage Rating (DC): 50V; Features: Moisture Resistant; Length: 0.063inch; Height: 0.022inch; Width: 0.8mm; Lead Free: Lead Free; ComponentLink1URL: https://datasheet.ciiva.com/2454/pyu-r-int-thick-7-2454747.pdf?src-supplier=Digi-Key; ComponentLink1Description: https://datasheet.ciiva.com/2454/pyu-r-int-thick-7-2454747.pdf?src-supplier=Digi-Key; ComponentLink2URL: https://datasheet.ciiva.com/2454/pyu-r-int-thick-7-2454748.pdf?src-supplier=Digi-Key; ComponentLink2Description: https://datasheet.ciiva.com/2454/pyu-r-int-thick-7-2454748.pdf?src-supplier=Digi-Key; ComponentLink3URL: https://datasheet.ciiva.com/2454/pyu-r-int-thick-7-2454749.pdf?src-supplier=Digi-Key; ComponentLink3Description: https://datasheet.ciiva.com/2454/pyu-r-int-thick-7-2454749.pdf?src-supplier=Digi-Key; Supplier Part Number 1: RC0603FR-0716RL-CUTT; .SCHCHK: USED
footprint R-0603
pins: 1, 2

## R-17K4-0603
designator R?, comment 17K4  Tolerance: 1%  Case/Package: 0603
RES 17.4K OHM 1% 1/10W 0603; Manufacturer: Stackpole Electronics; Manufacturer Part Number: RMCF0603FT17K4; Resistance: 17.4kR; Power Rating: 100mW; Temperature Coefficient: 100ppm/°C; Washability: OK; .Creator: M.OZKAN; .PCBCHK: USED; RoHS: Yes; Mount: Surface Mount; Case Code (Metric): 1608; Contact Plating: Tin,Matte; Case Code (Imperial): 0603; Min Operating Temperature: -55°C; Max Operating Temperature: 155°C; Features: Automotive AEC-Q200; Composition: Thick Film; Number of Terminations: 2; Packaging: Tape and Reel; Max Power Dissipation: 100mW; Length: 0.061inch; Height: 0.022inch; Width: 0.031inch; Radiation Hardening: No; Lead Free: Lead Free; ComponentLink1URL: https://www.seielect.com/catalog/SEI-RMCF_RMCP.pdf?src-supplier=Avnet; ComponentLink1Description: https://www.seielect.com/catalog/SEI-RMCF_RMCP.pdf?src-supplier=Avnet; ComponentLink2URL: https://www.seielect.com/catalog/SEI-Packaging.pdf?src-supplier=Digi-Key; ComponentLink2Description: https://www.seielect.com/catalog/SEI-Packaging.pdf?src-supplier=Digi-Key; ComponentLink3URL: http://www.seielect.com/Catalog/SEI-RMC.pdf?src-supplier=Future+Electronics; ComponentLink3Description: http://www.seielect.com/Catalog/SEI-RMC.pdf?src-supplier=Future+Electronics; Supplier 1: Digi-Key; Supplier Part Number 1: RMCF0603FT17K4CT-ND; Stock: 55004; Pricing: 1=0.1, 10=0.016, 100=0.0065, 1000=0.0029, 2500=0.0025 (USD); .SCHCHK: USED
footprint R-0603
pins: 1, 2

## R-20K-0402
designator R?, comment 20K  Case/Package: 0402
RES SMD 20K OHM 1% 1/10W 0402; Manufacturer: Vishay BCcomponents; Manufacturer Part Number: MCS04020C2002FE000; Resistance: 20kR; Temperature Coefficient: 50ppm/°C; Max Power Dissipation: 63mW; Power Rating: 62.5mW; Voltage Rating: 50V; .PCBCHK: USED; .Creator: F:TALI; Washability: OK; Stock 1: 23417; Pricing 1: 1=0.3, 10=0.254, 100=0.0993, 1000=0.04158, 2500=0.03812, 5000=0.03465 (USD); Contact Plating: Tin; Min Operating Temperature: -55°C; Max Operating Temperature: 125°C; Tolerance: 1%; Composition: Thin Film; Packaging: Tape and Reel; Military Standard: Not; Length: 1mm; Depth: 0.5mm; Width: 500um; Radiation Hardening: No; Lead Free: Lead Free; Stock 2: 1264584; Pricing 2: 1=0.1, 10=0.021, 100=0.0087, 1000=0.00391, 2500=0.00339, 5000=0.0028 (USD); Case Code (Metric): 1005; Case Code (Imperial): 0402; Number of Terminations: 2; Features: Moisture Resistant; Height: 0.016inch; ComponentLink1URL: http://www.samsungsem.com/kr/support/product-search/chip-resistor/RC1005F203CS.jsp; ComponentLink1Description: http://www.samsungsem.com/kr/support/product-search/chip-resistor/RC1005F203CS.jsp; Stock 3: 156753; Pricing 3: 1=0.1, 10=0.047, 100=0.0191, 1000=0.0086, 2500=0.00746, 5000=0.00617 (USD); Mount: Surface Mount; Package Quantity: 10000; Termination: SMD/SMT; Thickness: 356um; ComponentLink2URL: http://www.bourns.com/pdfs/CR0402.pdf; ComponentLink2Description: http://www.bourns.com/pdfs/CR0402.pdf; .SCHCHK: USED; Supplier 1: Digi-Key; Supplier Part Number 1: CR0402-FX-2002GLFDKR-ND
footprint R-0402
pins: 1, 2

## R-20K-0603
designator R?, comment 20K  Case Code (Imperial): 0603
RES SMD 20K OHM 1/10W 1% 0603; Manufacturer: Panasonic; Manufacturer Part Number: ERJ-3EKF2002V; Resistance: 20kR; Temperature Coefficient: 100ppm/°C; Power Rating: 100mW; Voltage Rating: 75V; Voltage Rating (DC): 50V; .PCBCHK: USED; .Creator: F:TALI; Washability: OK; Stock 1: 4426310; Pricing 1: 1=0.1, 10=0.065, 100=0.0264, 1000=0.01186, 2500=0.01029 (USD); Mount: Surface Mount; Case/Package: 0603; Weight: 7.1E-05oz; Contact Plating: Tin; Case Code (Metric): 1608; Min Operating Temperature: -55°C; Max Operating Temperature: 155°C; Tolerance: 1%; Composition: Thick Film; Packaging: Tape and Reel; Military Standard: Not; Package Quantity: 1; Termination: SMD/SMT; Number of Terminations: 2; Max Power Dissipation: 100mW; Working Voltage: 75V; Features: Automotive AEC-Q200; Length: 1.6mm; Height: 0.45mm; Depth: 0.8mm; Width: 0.8mm; Radiation Hardening: No; REACH SVHC: No SVHC; Lead Free: Lead Free; ComponentLink1URL: http://www.farnell.com/datasheets/1678782.pdf; ComponentLink1Description: http://www.farnell.com/datasheets/1678782.pdf; ComponentLink2URL: https://www.verical.com/server-webapp/html/getDatasheet?partID=248555; ComponentLink2Description: https://www.verical.com/server-webapp/html/getDatasheet?partID=248555; Stock 2: 60732; Pricing 2: 1=0.1, 10=0.056, 100=0.0228, 1000=0.01026 (USD); ComponentLink3URL: http://www.mouser.com/ds/2/54/chpreztr-977002.pdf; ComponentLink3Description: http://www.mouser.com/ds/2/54/chpreztr-977002.pdf; Stock 3: 366995; Pricing 3: 1=0.1, 10=0.018, 100=0.0071, 1000=0.00321, 2500=0.00278 (USD); ComponentLink4URL: https://www.verical.com/server-webapp/html/getDatasheet?partID=359905; ComponentLink4Description: https://www.verical.com/server-webapp/html/getDatasheet?partID=359905; .SCHCHK: USED; Supplier 1: Digi-Key; Supplier Part Number 1: RMCF0603FT20K0DKR-ND
footprint R-0603
pins: 1, 2

## R-20K-0805
designator R?, comment 20K  Case Code (Imperial): 0805